# Altium footprint library 医疗床16x16.PcbLib: 38 footprints (part 2 of 3)
Each footprint in its own frame and in the unit in brackets; x right, y up, seen from the top. Pads: shape width x height; smd on the part's side, far side on the other; paste and mask are expansions set on the pad; w line width, h text height; cw(c..) or ccw(c..) is an arc to the next point about the centre after c.
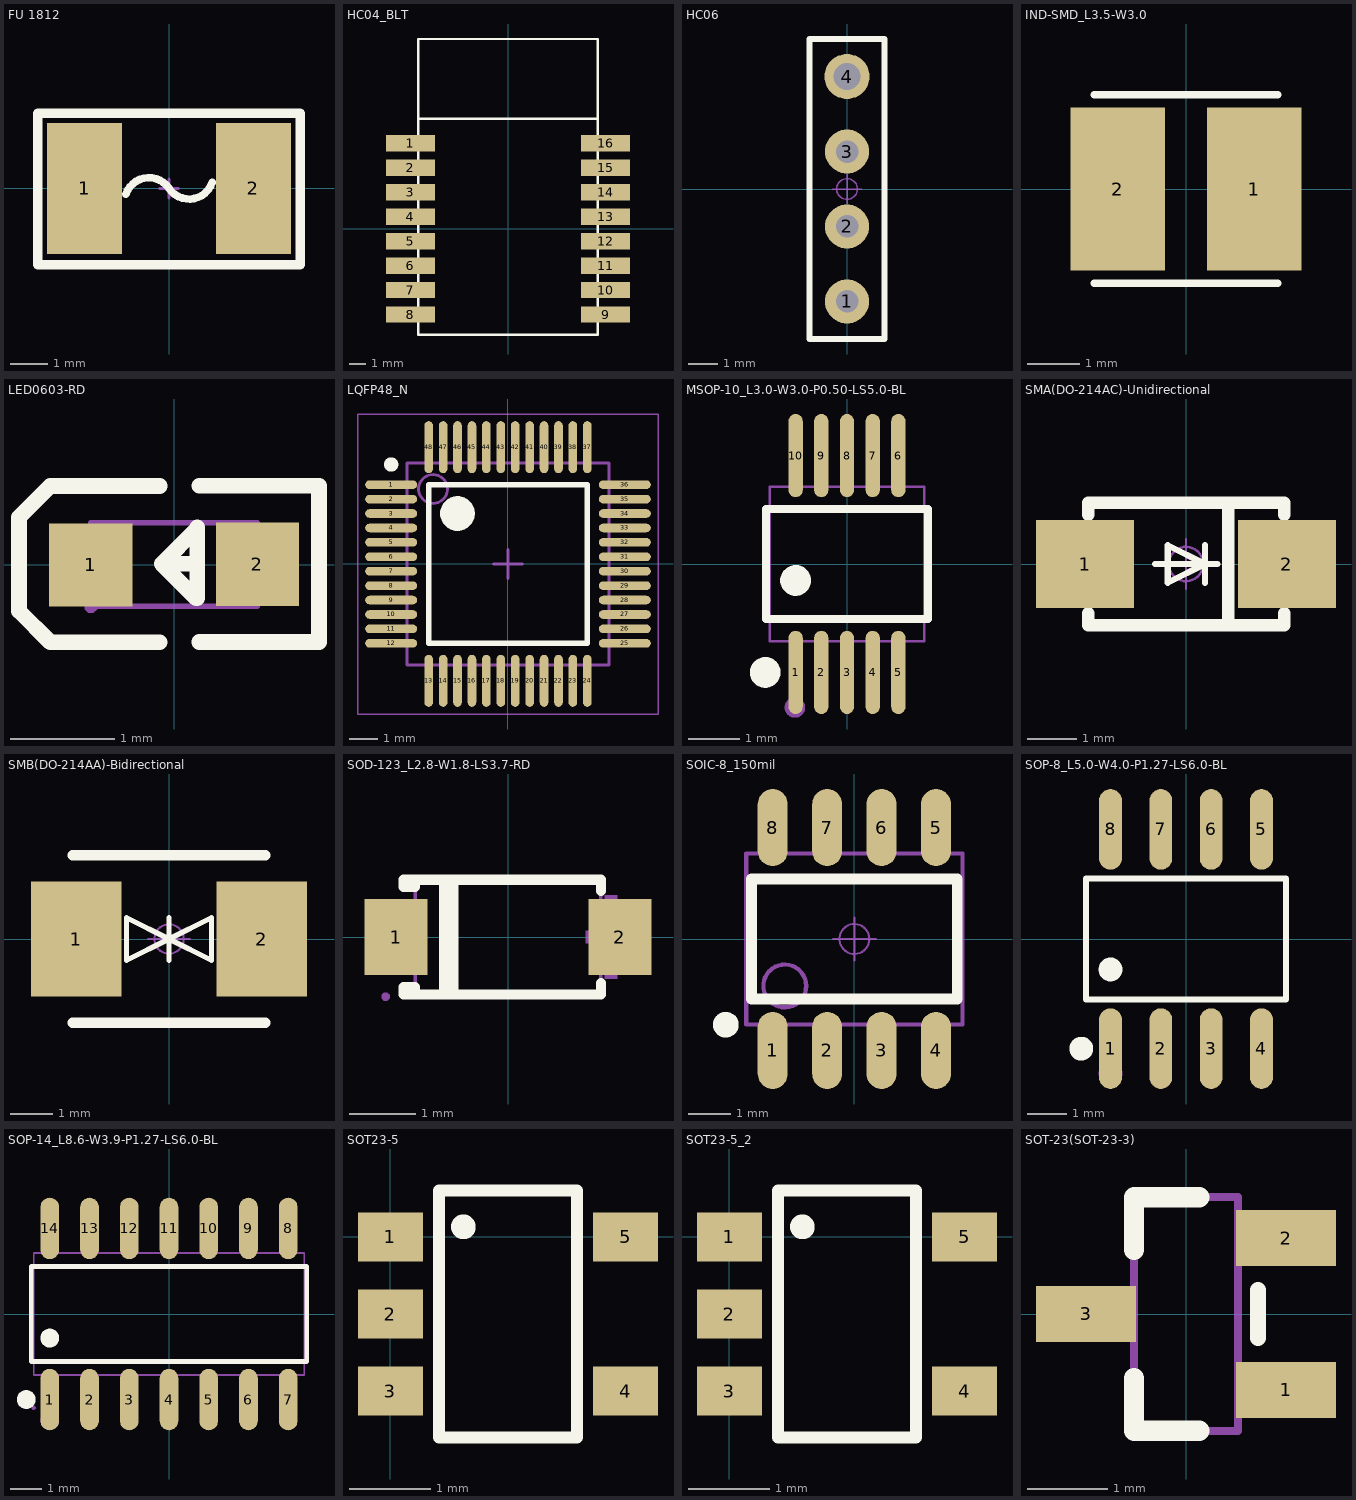
[diagram p1: the footprints below, top view; thin cyan lines are the x and y axes]

## FU 1812 [mm]
pads (2):
  rect 2x3.5 smd: 1(-2.25,0) 2(2.25,0)
Top Overlay:
  lines w0.203: -1.15,-0.156 cw(c-0.537,-0.362) 0,0 ccw(c0.537,0.362) 1.15,0.156
  lines w0.254: -3.5,-2.032 3.5,-2.032 ; -3.5,-2 -3.5,2 0,2 ; 2.159,2 3.5,2 3.5,-2 ; 2.54,2 -0.254,2 ; -0.254,2 -0.254,2
Mechanical 15:
  lines w0.076: -0.254,0 0.254,0 ; 0,-0.254 0,0.254
3D body "FU 01812.STEP": height 0.87, standoff 0, extent -2.3,-1.61 2.3,1.61

## HC04_BLT [mm] "Bluetooth_HC06"
pads (16):
  rect 3x1 smd: 1(-6,5.25) 2(-6,3.75) 3(-6,2.25) 4(-6,0.75) 5(-6,-0.75) 6(-6,-2.25) 7(-6,-3.75) 8(-6,-5.25) 9(5.981,-5.25) 10(5.981,-3.75) 11(5.981,-2.25) 12(5.981,-0.75) 13(5.981,0.75) 14(5.981,2.25) 15(5.981,3.75) 16(5.981,5.25)
Top Overlay:
  lines w0.152: -5.5,6.75 -5.5,11.65 5.5,11.65 5.5,6.75 ; -5.5,6.75 -5.5,-6.5 5.5,-6.5 5.5,6.75 ; -5.5,6.75 5.5,6.75

## HC06 [mm]
pads (4):
  round 1.5 hole 0.762: 1(0,-3.81) 2(0,-1.27) 3(0,1.27)
  round 1.524 hole 0.9: 4(0,3.81)
Top Overlay:
  lines w0.2: -1.27,-5.08 -1.27,5.08 1.27,5.08 1.27,-5.08 -1.27,-5.08
Mechanical 15:
  circle w0.05: c0,0 r0.35
  lines w0.05: -0.5,0 0.5,0 ; 0,-0.5 0,0.5

## IND-SMD_L3.5-W3.0 [mm]
pads (2):
  rect 1.8x3.12 smd: 1(1.303,0) 2(-1.303,0)
Top Overlay:
  lines w0.15: -1.75,-1.8 1.75,-1.8 ; -1.75,1.8 1.75,1.8
3D body "CD32.STEP": height 2.15, standoff 0.05, extent -1.682,-1.5 1.732,1.5

## LED0603-RD [mm]
pads (2):
  rect 0.8x0.8 smd: 1(-0.799,-0.003) 2(0.799,0.003)
Top Overlay:
  lines w0.15: -0.14,-0.746 -1.19,-0.746 -1.49,-0.446 -1.49,-0.346 -1.49,0.354 -1.49,0.454 -1.19,0.754 -0.14,0.754 ; 0.22,0.007 -0.12,0.007 ; 0.24,-0.744 1.39,-0.744 ; 0.24,0.757 1.39,0.757 1.39,-0.723 ; -0.12,0.007 0.22,0.347 0.22,0.357 0.22,-0.324 0.21,-0.324 -0.12,0.007
Mechanical 6:
  region: 0.529,0.068 1.069,0.068 1.069,-0.062 0.529,-0.062
  region: 0.735,-0.267 0.735,0.273 0.865,0.273 0.865,-0.267
  region: -1.07,0.062 -0.53,0.062 -0.53,-0.068 -1.07,-0.068
Mechanical 15:
  region: 0.5,-0.396 0.5,0.404 0.8,0.404 0.8,-0.396
  region: -0.8,-0.403 -0.8,0.397 -0.5,0.397 -0.5,-0.403
  region: -0.739,-0.403 -0.739,-0.379 -0.775,-0.344 -0.824,-0.344 -0.859,-0.379 -0.859,-0.403 -0.859,-0.428 -0.824,-0.463 -0.775,-0.463 -0.739,-0.428
  lines w0.051: -0.8,-0.4 0.8,-0.4 0.8,0.4 -0.8,0.4 -0.8,-0.4
3D body "3D_0603蓝灯_2023-06-26.step": height 0.56, standoff 0, extent -0.93,-0.403 0.69,0.417

## LQFP48_N [mm]
pads (48):
  oval 1.8x0.3 smd: 1(-4.05,2.75) 2(-4.05,2.25) 3(-4.05,1.75) 4(-4.05,1.25) 5(-4.05,0.75) 6(-4.05,0.25) 7(-4.05,-0.25) 8(-4.05,-0.75) 9(-4.05,-1.25) 10(-4.05,-1.75) 11(-4.05,-2.25) 12(-4.05,-2.75) 25(4.05,-2.75) 26(4.05,-2.25) 27(4.05,-1.75) 28(4.05,-1.25) 29(4.05,-0.75) 30(4.05,-0.25) 31(4.05,0.25) 32(4.05,0.75) 33(4.05,1.25) 34(4.05,1.75) 35(4.05,2.25) 36(4.05,2.75)
  oval 0.3x1.8 smd: 13(-2.75,-4.05) 14(-2.25,-4.05) 15(-1.75,-4.05) 16(-1.25,-4.05) 17(-0.75,-4.05) 18(-0.25,-4.05) 19(0.25,-4.05) 20(0.75,-4.05) 21(1.25,-4.05) 22(1.75,-4.05) 23(2.25,-4.05) 24(2.75,-4.05) 37(2.75,4.05) 38(2.25,4.05) 39(1.75,4.05) 40(1.25,4.05) 41(0.75,4.05) 42(0.25,4.05) 43(-0.25,4.05) 44(-0.75,4.05) 45(-1.25,4.05) 46(-1.75,4.05) 47(-2.25,4.05) 48(-2.75,4.05)
Top Overlay:
  circle w0.6: c-1.75,1.75 r0.3
  circle w0.25: c-4.05,3.45 r0.125
  lines w0.2: -2.75,-2.75 2.75,-2.75 2.75,2.75 -2.75,2.75 -2.75,-2.75
Mechanical 13:
  circle w0.1: c-2.6,2.6 r0.5
  lines w0.1: -3.5,-3.5 3.5,-3.5 3.5,3.5 -3.5,3.5 -3.5,-3.5
Mechanical 15:
  lines w0.05: -5.2,-5.2 5.2,-5.2 5.2,5.2 -5.2,5.2 -5.2,-5.2
  lines w0.1: -0.5,0 0.5,0 ; 0,-0.5 0,0.5
3D body "LQFP48-7x7.STEP": height 1.45, standoff 0, extent -4.503,-4.503 4.503,4.503

## MSOP-10_L3.0-W3.0-P0.50-LS5.0-BL [mil]
pads (10):
  oval 11x63.8 smd mask+2: 1(-39.4,-83.1) 2(-19.7,-83.1) 3(0,-83.1) 4(19.7,-83.1) 5(39.4,-83.1) 6(39.4,83.1) 7(19.7,83.1) 8(0,83.1) 9(-19.7,83.1) 10(-39.4,83.1)
Top Overlay:
  circle w11.8: c-62.7,-83.1 r5.9
  circle w11.8: c-39.4,-12.6 r5.9
  lines w6: -62.1,-42.2 62.1,-42.2 62.1,42.2 -62.1,42.2 -62.1,-42.2
Mechanical 6:
  circle w7.9: c-40,-110 r3.9
Mechanical 15:
  region: 34.9,75.2 34.9,58.7 43.8,58.7 43.8,75.2
  region: 34.9,96.5 34.9,74.8 43.8,74.8 43.8,96.5
  region: 15.3,75.2 15.3,58.7 24.1,58.7 24.1,75.2
  region: 15.3,96.5 15.3,74.8 24.1,74.8 24.1,96.5
  region: -4.4,75.2 -4.4,58.7 4.4,58.7 4.4,75.2
  region: -4.4,96.5 -4.4,74.8 4.4,74.8 4.4,96.5
  region: -24.1,75.2 -24.1,58.7 -15.3,58.7 -15.3,75.2
  region: -24.1,96.5 -24.1,74.8 -15.3,74.8 -15.3,96.5
  region: -43.8,75.2 -43.8,58.7 -34.9,58.7 -34.9,75.2
  region: -43.8,96.5 -43.8,74.8 -34.9,74.8 -34.9,96.5
  region: 34.9,-75.2 34.9,-58.7 43.8,-58.7 43.8,-75.2
  region: 34.9,-96.5 34.9,-74.8 43.8,-74.8 43.8,-96.5
  region: 15.3,-75.2 15.3,-58.7 24.1,-58.7 24.1,-75.2
  region: 15.3,-96.5 15.3,-74.8 24.1,-74.8 24.1,-96.5
  region: -4.4,-75.2 -4.4,-58.7 4.4,-58.7 4.4,-75.2
  region: -4.4,-96.5 -4.4,-74.8 4.4,-74.8 4.4,-96.5
  region: -24.1,-75.2 -24.1,-58.7 -15.3,-58.7 -15.3,-75.2
  region: -24.1,-96.5 -24.1,-74.8 -15.3,-74.8 -15.3,-96.5
  region: -43.8,-75.2 -43.8,-58.7 -34.9,-58.7 -34.9,-75.2
  region: -43.8,-96.5 -43.8,-74.8 -34.9,-74.8 -34.9,-96.5
  lines w2: -59.1,-59.1 59.1,-59.1 59.1,59.1 -59.1,59.1 -59.1,-59.1
3D body "3D_RS2255XN_2022-11-23.step": height 41.34, standoff -2.01, extent -59.05,-98.42 59.05,98.42

## SMA(DO-214AC)-Unidirectional [mm]
pads (2):
  rect 2x1.8 smd: 1(-2.057,0) 2(2.057,0)
Top Overlay:
  lines w0.127: -0.627,0 0.643,0 ; 0.389,-0.381 0.389,0 ; 0.389,0.381 0.389,0 ; 0.389,0 -0.373,0.381 -0.373,0 -0.373,-0.381 0.389,0
  lines w0.254: -1.991,-1 -1.991,-1.25 2.007,-1.25 2.007,-1 ; -1.991,1 -1.991,1.25 2.007,1.25 2.007,1 ; 0.864,-1.245 0.864,1.245
Mechanical 15:
  circle w0.05: c0,0 r0.35
  lines w0.05: -0.5,0 0.5,0 ; 0,-0.5 0,0.5
3D body: height 1.27, standoff 0, extent -2.613,-2.591 2.461,2.489

## SMB(DO-214AA)-Bidirectional [mil]
pads (2):
  rect 85x108 smd: 1(-87,0) 2(87,0)
Top Overlay:
  lines w5: 0,-20 0,20 0,0 ; 0,0 -40,20 -40,-20 0,0 ; 0,0 40,-20 40,20 0,0
  lines w10: -90.55,-78.74 90.55,-78.74 ; -90.55,78.74 90.55,78.74
Mechanical 15:
  circle w1.97: c0,0 r13.78
  lines w1.97: -19.68,0 19.68,0 ; 0,-19.68 0,19.68
3D body: height 10, standoff 0, extent -110.23,-76.76 110.24,76.78

## SOD-123_L2.8-W1.8-LS3.7-RD [mm]
pads (2):
  rect 0.95x1.15 smd mask+0.051: 1(-1.692,0) 2(1.692,0)
Top Overlay:
  lines w0.152: -0.97,-0.866 -0.97,0.866 ; -0.827,-0.866 -0.827,0.866 ; 1.406,-0.698 1.406,-0.866 -1.406,-0.866 ; 1.406,0.698 1.406,0.866 -1.406,0.866 ; -1.406,-0.866 -1.406,-0.755 -1.58,-0.755 -1.58,-0.866 -1.406,-0.866 ; -1.406,0.866 -1.406,0.755 -1.58,0.755 -1.58,0.866 -1.406,0.866
Mechanical 6:
  region: 1.651,0.635 1.651,-0.629 1.461,-0.629 1.461,0.635
  region: 1.935,0.098 1.935,-0.092 1.177,-0.092 1.177,0.098
  region: -2.03,0.095 -2.03,-0.095 -1.272,-0.095 -1.272,0.095
Mechanical 15:
  region: 1.851,-0.465 1.851,0.465 1.301,0.465 1.301,-0.465
  region: -1.851,-0.465 -1.851,0.465 -1.301,0.465 -1.301,-0.465
  region: -1.79,-0.9 -1.79,-0.875 -1.826,-0.84 -1.875,-0.84 -1.91,-0.875 -1.91,-0.9 -1.91,-0.925 -1.875,-0.96 -1.826,-0.96 -1.79,-0.925
  lines w0.051: -1.4,-0.9 1.4,-0.9 1.4,0.9 -1.4,0.9 -1.4,-0.9

## SOIC-8_150mil [mm]
pads (8):
  oval 0.7x1.8 smd: 1(-1.905,-2.6) 2(-0.635,-2.6) 3(0.635,-2.6) 4(1.905,-2.6) 5(1.905,2.6) 6(0.635,2.6) 7(-0.635,2.6) 8(-1.905,2.6)
Top Overlay:
  circle w0.3: c-3,-2 r0.15
  lines w0.254: -2.4,-1.4 2.4,-1.4 2.4,1.4 -2.4,1.4 -2.4,-1.4
Mechanical 13:
  circle w0.1: c-1.625,-1.095 r0.5
  lines w0.1: -2.525,-1.995 2.525,-1.995 2.525,1.995 -2.525,1.995 -2.525,-1.995
Mechanical 15:
  circle w0.05: c0,0 r0.35
  lines w0.05: -0.5,0 0.5,0 ; 0,-0.5 0,0.5
3D body "SOP8.STEP": height 1.6, standoff 0, extent -2.51,-3.021 2.51,3.021

## SOP-8_L5.0-W4.0-P1.27-LS6.0-BL [mm]
pads (8):
  oval 0.574x2.036 smd: 1(-1.905,-2.768) 2(-0.635,-2.768) 3(0.635,-2.768) 4(1.905,-2.768) 5(1.905,2.768) 6(0.635,2.768) 7(-0.635,2.768) 8(-1.905,2.768)
Top Overlay:
  circle w0.3: c-2.644,-2.768 r0.15
  circle w0.3: c-1.905,-0.769 r0.15
  lines w0.152: -2.526,-1.521 2.526,-1.521 2.526,1.521 -2.526,1.521 -2.526,-1.521
Mechanical 15:
  circle w0.3: c-1.905,-3.398 r0.15
3D body "SOP8.STEP": height 1.6, standoff 0, extent -2.485,-2.945 2.535,3.097

## SOP-14_L8.6-W3.9-P1.27-LS6.0-BL [mm]
pads (14):
  oval 0.595x1.968 smd mask+0.051: 1(-3.81,-2.734) 2(-2.54,-2.734) 3(-1.27,-2.734) 4(0,-2.734) 5(1.27,-2.734) 6(2.54,-2.734) 7(3.81,-2.734) 8(3.81,2.734) 9(2.54,2.734) 10(1.27,2.734) 11(0,2.734) 12(-1.27,2.734) 13(-2.54,2.734) 14(-3.81,2.734)
Top Overlay:
  circle w0.3: c-3.81,-0.769 r0.15
  circle w0.3: c-4.56,-2.734 r0.15
  lines w0.152: -4.401,-1.521 -4.401,1.521 4.401,1.521 4.401,-1.521 -4.401,-1.521
Mechanical 6:
  circle w0.3: c-3.81,-3.4 r0.15
Mechanical 15:
  drawing of 33 lines, arcs and shapes, not listed
3D body "3D_LMV324_2022-11-23.step": height 1.47, standoff -0.08, extent -4.315,-3 4.315,3

## SOT23-5 [mm]
pads (5):
  rect 0.8x0.6 smd: 1(0,0) 2(0,-0.95) 3(0,-1.9) 4(2.9,-1.9) 5(2.9,0)
Top Overlay:
  circle w0.254: c0.9,0.125 r0.025
  lines w0.15: 0.6,-2.475 0.6,0.575 2.3,0.575 2.3,-2.475 0.6,-2.475
3D body "User Library-SOT23-5-2.STEP": height 1.45, standoff 0, extent 0.022,-2.415 2.822,0.485

## SOT23-5_2 [mm]
pads (5):
  rect 0.8x0.6 smd: 1(0,0) 2(0,-0.95) 3(0,-1.9) 4(2.9,-1.9) 5(2.9,0)
Top Overlay:
  circle w0.254: c0.9,0.125 r0.025
  lines w0.15: 0.6,-2.475 0.6,0.575 2.3,0.575 2.3,-2.475 0.6,-2.475
3D body "User Library-SOT23-5-2.STEP": height 1.45, standoff 0, extent 0.023,-2.415 2.822,0.485

## SOT-23(SOT-23-3) [mm]
pads (3):
  rect 1.25x0.7 smd: 1(1.25,-0.95) 2(1.25,0.95) 3(-1.25,0)
Top Overlay:
  lines w0.2: 0.9,-0.3 0.9,0.3
  lines w0.254: -0.65,-0.8 -0.65,-1.46 0.165,-1.46 ; 0.165,1.46 -0.65,1.46 ; -0.65,0.8 -0.65,1.46 ; -0.65,0.8 -0.65,1.46 ; -0.65,0.8 -0.65,1.46
Mechanical 13:
  lines w0.1: -0.65,-1.46 -0.65,1.46 ; -0.65,-1.46 0.65,-1.46 ; -0.65,-1.46 0.65,-1.46 ; -0.65,-1.46 -0.65,1.46 ; -0.65,-1.46 0.65,-1.46 ; -0.65,-1.46 -0.65,1.46 ; -0.65,1.46 0.65,1.46 ; -0.65,1.46 0.65,1.46 ; -0.65,1.46 0.65,1.46 ; 0.65,-1.46 0.65,1.46 ; 0.65,-1.46 0.65,1.46 ; 0.65,-1.46 0.65,1.46
3D body "SOT-23.step": height 1.3, standoff 0, extent -1.5,-1.5 1.5,1.5